# Altium footprint library Connectors.PcbLib: 92 footprints (part 3 of 6)
Each footprint in its own frame and in the unit in brackets; x right, y up, seen from the top. Pads: shape width x height; smd on the part's side, far side on the other; paste and mask are expansions set on the pad; w line width, h text height; cw(c..) or ccw(c..) is an arc to the next point about the centre after c.
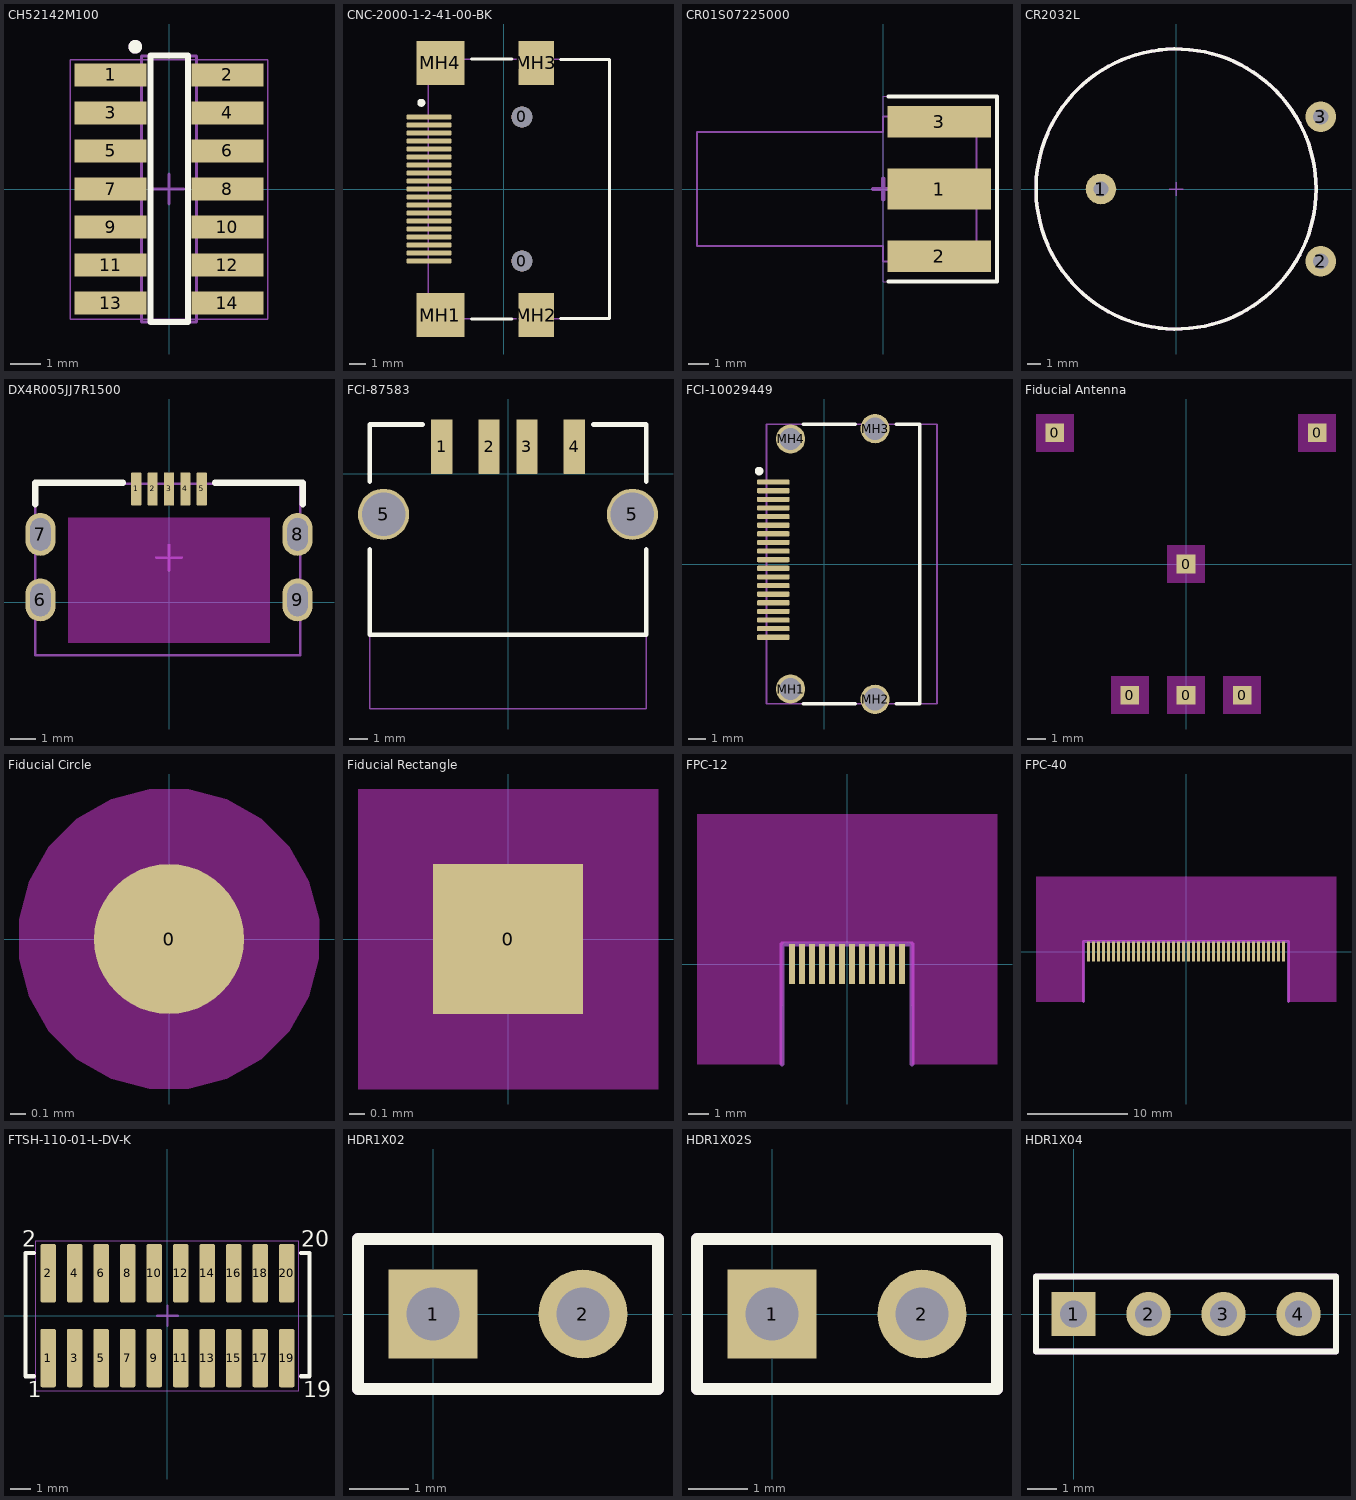
[diagram p2: the footprints below, top view; thin cyan lines are the x and y axes]

## CH52142M100 [mm]
height 5.5
pads (14):
  rect 2.4x0.762 smd: 1(-1.95,3.81) 2(1.95,3.81) 3(-1.95,2.54) 4(1.95,2.54) 5(-1.95,1.27) 6(1.95,1.27) 7(-1.95,0) 8(1.95,0) 9(-1.95,-1.27) 10(1.95,-1.27) 11(-1.95,-2.54) 12(1.95,-2.54) 13(-1.95,-3.81) 14(1.95,-3.81)
Top Overlay:
  circle w0.254: c-1.125,4.75 r0.1
  lines w0.2: -0.617,-4.445 -0.617,4.46 0.633,4.46 0.633,-4.445 -0.617,-4.445
Mechanical 13:
  circle w0.254: c-1.125,4.75 r0.1
  lines w0.1: -0.925,-4.45 -0.925,4.45 0.925,4.45 0.925,-4.45 -0.925,-4.45
  text ".Designator" at 0.05,1.225 h0.51
  text ".Comment" at -0.65,1.2 h0.51
Mechanical 15:
  lines w0.05: -3.3,-4.35 -3.3,4.325 3.3,4.325 3.3,-4.35 -3.3,-4.35
  lines w0.1: -0.5,0 0.5,0 ; 0,-0.5 0,0.5
3D body "Samtec-FTSH-107-01-L-DV.step": height 5.97, standoff 0, extent -2.921,-4.445 2.921,4.445

## CNC-2000-1-2-41-00-BK [mm] "HDMI Type C, Female, Right-Angle, SMT"
height 6.3
pads (25):
  round 1.3 hole 1.3 unplated paste-1.3 mask-1.3: 0(1.124,-4.5) 0(1.124,4.5)
  rrect50% 2.82x0.33 smd: 1(-4.686,4.5) 2(-4.686,4) 3(-4.686,3.5) 4(-4.686,3) 5(-4.686,2.5) 6(-4.686,2) 7(-4.686,1.5) 8(-4.686,1) 9(-4.686,0.5) 10(-4.686,0) 11(-4.686,-0.5) 12(-4.686,-1) 13(-4.686,-1.5) 14(-4.686,-2) 15(-4.686,-2.5) 16(-4.686,-3) 17(-4.686,-3.5) 18(-4.686,-4) 19(-4.686,-4.5)
  rect 3x2.75 smd: MH1(-3.976,-7.875) MH4(-3.976,7.875)
  rect 2.2x2.75 smd: MH2(2.024,-7.875) MH3(2.024,7.875)
Top Overlay:
  circle w0.25: c-5.161,5.39 r0.125
  lines w0.2: -2.032,-8.128 0.508,-8.128 ; -2.032,8.128 0.508,8.128 ; 3.556,-8.1 6.604,-8.1 6.604,8.1 3.556,8.1
Mechanical 13:
  lines w0.1: -4.736,-8.1 -4.736,8.1 6.604,8.1 6.604,-8.1 -4.736,-8.1
  text ".Designator" at -2.186,6.1 h0.51
  text ".Comment" at -2.161,5.4 h0.51

## CR01S07225000 [mm] "Board edge SMA female jack connector"
height 3.5
pads (3):
  rect 5x2 smd: 1(2.7,0)
  rect 5x1.5 smd: 2(2.7,-3.25) 3(2.7,3.25)
Top Overlay:
  lines w0.2: 0.25,-4.475 5.5,-4.475 5.5,0 5.5,4.475 0.25,4.475
Mechanical 13:
  lines w0.1: -9,-2.75 0,-2.75 0,-3.5 4.5,-3.5 4.5,0 4.5,3.5 0,3.5 0,2.75 -9,2.75 -9,0 -9,-2.75
  text ".Designator" at -2.125,0.1 h0.51
  text ".Comment" at -2.1,-0.6 h0.51
Mechanical 15:
  lines w0.05: 0,-4.475 5.5,-4.475 5.5,4.475 0,4.475 0,-4.475
  lines w0.2: -0.5,0 0.5,0 ; 0,-0.5 0,0.5
3D body "SMA Female for PCB edge Mount.STEP": height 3.45, standoff -2.6, extent -9.6,-3 4,3

## CR2032L [mm] "Lithium coincell 3V"
height 6
pads (3):
  round 2.2 hole 1.1: 1(-5.4,0) 2(10.4,-5.2) 3(10.4,5.2)
Top Overlay:
  circle w0.254: c0,0 r10.07
Mechanical 13:
  circle w0.254: c0,0 r10.07
  text ".Comment" at -1.875,7.2 h0.51
  text ".Designator" at -1.9,7.9 h0.51
Mechanical 15:
  circle w0.1: c0,0 r10.07
  lines w0.1: -0.5,0 0.5,0 ; 0,-0.5 0,0.5
3D body "cr2032l.step": height 5.4, standoff -3.75, extent -10.05,-10.07 10.44,10.041

## DX4R005JJ7R1500 [mm] "MicroUSB A/B SMT, midmount"
height 1.2
pads (9):
  rrect10% 0.4x1.3 smd: 1(-1.3,4.5) 2(-0.65,4.5) 3(0,4.5) 4(0.65,4.5) 5(1.3,4.5)
  oval 1.2x1.7 hole 0.8 slot 1.3 at 90 deg: 6(-5.1,0.1) 7(-5.1,2.7) 8(5.1,2.7) 9(5.1,0.1)
Top Overlay:
  lines w0.254: -5.3,3.9 -5.3,4.75 -1.825,4.75 ; 1.825,4.75 5.3,4.75 5.3,3.9
Keep-Out Layer:
  board cut-out: -4,3.35 4,3.35 4,-1.6 -4,-1.6
Mechanical 13:
  lines w0.1: -5.3,-2.1 5.2,-2.1 5.2,4.7 -5.3,4.7 -5.3,-2.1
  text ".Designator" at -4.5,6.15 h0.51
  text ".Comment" at -4.5,5.475 h0.51
Mechanical 15:
  lines w0.1: -0.5,1.775 0.5,1.775 ; 0,1.275 0,2.275
3D body "K3D-DX4R005JJ7-V1_JAE_Color.STEP": height 1.23, standoff -1.61, extent -5.25,-2.1 5.25,4.65

## FCI-87583 [mm] "USB A 2.0 connector Female, SMT"
height 7.74
pads (6):
  rect 1.12x2.88 smd: 1(-3.5,1.44) 2(-1,1.44) 3(1,1.44) 4(3.5,1.44)
  round 2.7 hole 2.3: 5(-6.57,-2.14) 5(6.57,-2.14)
Top Overlay:
  lines w0.254: -7.3,-4 -7.3,-8.5 7.3,-8.5 7.3,-4 ; -7.3,-0.4 -7.3,2.6 -4.5,2.6 ; 4.5,2.6 7.3,2.6 7.3,-0.4
Mechanical 13:
  lines w0.1: -7.3,-4 -7.3,-12.4 7.3,-12.4 7.3,-4 ; -7.3,-0.4 -7.3,2.6 -4.5,2.6 ; 4.5,2.6 7.3,2.6 7.3,-0.4
3D body "875830010bhlf.stp": height 7.74, standoff -2.63, extent -7.25,-12.4 7.25,2.483

## FCI-10029449 [mm] "HDMI Type C, Female, Right-Angle, SMT"
height 3.3
pads (23):
  rrect50% 1.9x0.3 smd: 1(-2.95,4.75) 2(-2.95,4.25) 3(-2.95,3.75) 4(-2.95,3.25) 5(-2.95,2.75) 6(-2.95,2.25) 7(-2.95,1.75) 8(-2.95,1.25) 9(-2.95,0.75) 10(-2.95,0.25) 11(-2.95,-0.25) 12(-2.95,-0.75) 13(-2.95,-1.25) 14(-2.95,-1.75) 15(-2.95,-2.25) 16(-2.95,-2.75) 17(-2.95,-3.25) 18(-2.95,-3.75) 19(-2.95,-4.25)
  round 1.7 hole 1.3 paste+0.038 mask+0: MH1(-1.95,-7.25) MH2(2.95,-7.85) MH3(2.95,7.85) MH4(-1.95,7.25)
Top Overlay:
  circle w0.25: c-3.775,5.39 r0.125
  lines w0.2: -1.2,-8.1 1.8,-8.1 ; -1.2,8.1 1.8,8.1 ; 4.168,-8.1 5.55,-8.1 5.55,8.1 4.194,8.1
Mechanical 13:
  lines w0.1: -3.35,-8.1 -3.35,8.1 6.55,8.1 6.55,-8.1 -3.35,-8.1
  text ".Designator" at -0.8,6.1 h0.51
  text ".Comment" at -0.775,5.4 h0.51
3D body "10029449-001LF.STEP": height 6.11, standoff -1.89, extent -3.35,-8.1 6.55,8.1

## Fiducial Antenna [mm] "Fiducial mark for antenna"
pads (6):
  rect 1x1 smd paste-0.75 mask+0.5: 0(-7,7) 0(-3,-7) 0(0,-7) 0(0,0) 0(3,-7) 0(7,7)
Top Layer keep-out:
  region: 2,-6 4,-6 4,-8 2,-8
  region: -4,-6 -2,-6 -2,-8 -4,-8
  region: -1,-6 1,-6 1,-8 -1,-8
  region: 6,8 8,8 8,6 6,6
  region: -8,8 -6,8 -6,6 -8,6
  region: -1,1 1,1 1,-1 -1,-1

## Fiducial Circle [mm]
pads (1):
  round 1 smd paste-0.75 mask+0.5: 0(0,0)
Top Layer keep-out:
  region: 0,1 0.132,1 0.386,0.932 0.614,0.8 0.8,0.614 0.932,0.386 1,0.132 1,-0.132 0.932,-0.386 0.8,-0.614 0.614,-0.8 0.386,-0.932 0.132,-1 0,-1 -0.132,-1 -0.386,-0.932 -0.614,-0.8 -0.8,-0.614 -0.932,-0.386 -1,-0.132 -1,0.132 -0.932,0.386 -0.8,0.614 -0.614,0.8 -0.386,0.932 -0.132,1

## Fiducial Rectangle [mm]
pads (1):
  rect 1x1 smd paste-0.75 mask+0.5: 0(0,0)
Top Layer keep-out:
  region: -1,1 1,1 1,-1 -1,-1

## FPC-12 [mm] "FPC PCB connector 12 pin"
pads (12):
  rect 0.3x2 smd paste-2 mask-1: 1(-2.75,0) 2(-2.25,0) 3(-1.75,0) 4(-1.25,0) 5(-0.75,0) 6(-0.25,0) 7(0.25,0) 8(0.75,0) 9(1.25,0) 10(1.75,0) 11(2.25,0) 12(2.75,0)
Top Solder:
  region: -3,-1.1 -3,1.1 3,1.1 3,-1.1
Keep-Out Layer:
  board cut-out: -3,1.1 -3.049,1.095 -3.139,1.058 -3.208,0.989 -3.245,0.899 -3.25,0.85 -3.25,-5 -7.5,-5 -7.5,7.5 7.5,7.5 7.5,-5 3.25,-5 3.25,0.85 3.245,0.899 3.208,0.989 3.139,1.058 3.049,1.095 3,1.1
Mechanical 13:
  lines w0.254: -3.25,-5 -3.25,1 3.25,1 3.25,-5

## FPC-40 [mm] "FPC PCB connector 40 pin"
pads (40):
  rect 0.3x2 smd paste-2 mask-1: 1(-9.75,0) 2(-9.25,0) 3(-8.75,0) 4(-8.25,0) 5(-7.75,0) 6(-7.25,0) 7(-6.75,0) 8(-6.25,0) 9(-5.75,0) 10(-5.25,0) 11(-4.75,0) 12(-4.25,0) 13(-3.75,0) 14(-3.25,0) 15(-2.75,0) 16(-2.25,0) 17(-1.75,0) 18(-1.25,0) 19(-0.75,0) 20(-0.25,0) 21(0.25,0) 22(0.75,0) 23(1.25,0) 24(1.75,0) 25(2.25,0) 26(2.75,0) 27(3.25,0) 28(3.75,0) 29(4.25,0) 30(4.75,0) 31(5.25,0) 32(5.75,0) 33(6.25,0) 34(6.75,0) 35(7.25,0) 36(7.75,0) 37(8.25,0) 38(8.75,0) 39(9.25,0) 40(9.75,0)
Top Solder:
  region: -10,-1.1 -10,1.1 10,1.1 10,-1.1
Keep-Out Layer:
  board cut-out: -10,1.1 -10.049,1.095 -10.139,1.058 -10.208,0.989 -10.245,0.899 -10.25,0.85 -10.25,-5 -15,-5 -15,7.5 15,7.5 15,-5 10.25,-5 10.25,0.85 10.245,0.899 10.208,0.989 10.139,1.058 10.049,1.095 10,1.1
Mechanical 13:
  lines w0.254: -10.25,-5 -10.25,1 10.25,1 10.25,-5

## FTSH-110-01-L-DV-K [mil] "Connector; Header; 10x2 Position,1.27mm SMT"
height 235.04
pads (20):
  rrect20% 29x110 smd: 1(-225,-80) 2(-225,80) 3(-175,-80) 4(-175,80) 5(-125,-80) 6(-125,80) 7(-75,-80) 8(-75,80) 9(-25,-80) 10(-25,80) 11(25,-80) 12(25,80) 13(75,-80) 14(75,80) 15(125,-80) 16(125,80) 17(175,-80) 18(175,80) 19(225,-80) 20(225,80)
Top Overlay:
  lines w7.87: -251.97,-114.17 -267.72,-114.17 -267.72,118.11 -251.97,118.11 ; 251.97,-114.17 267.72,-114.17 267.72,118.11 251.97,118.11
  text "19" at 255.91,-153.54 h30
  text "20" at 251.97,129.92 h30
  text "1" at -263.78,-153.54 h30
  text "2" at -273.62,129.92 h30
Mechanical 13:
  lines w1.97: -248.03,-141.73 -248.03,141.73 248.03,141.73 248.03,-141.73 -248.03,-141.73
  text ".Comment" at -90.55,-21.65 h20
  text ".Designator" at -110.24,7.87 h20
Mechanical 15:
  lines w1.97: -248.03,-141.73 248.03,-141.73 248.03,141.73 -248.03,141.73 -248.03,-141.73
  lines w3.94: -19.68,-0.12 19.68,-0.12 ; 0,-19.8 0,19.57
3D body "Samtec-FTSH-110-01-L-DV-K.STEP": height 241, standoff 0, extent -248.49,-115.11 248.51,114.89

## HDR1X02 [mm] "Connector; Header; 2 Position"
pads (2):
  rect 1.5x1.5 hole 0.9: 1(0,0)
  round 1.5 hole 0.9: 2(2.54,0)
Top Overlay:
  lines w0.2: -1.27,-1.27 3.81,-1.27 3.81,1.27 -1.27,1.27 -1.27,-1.27
Mechanical 13:
  lines w0.2: -1.27,-1.27 3.81,-1.27 3.81,1.27 -1.27,1.27 -1.27,-1.27
  text ".Designator" at -1.125,1.625 h0.51
  text ".Comment" at -0.675,-1.925 h0.51
3D body "pin_header_aw_109_02-t.stp": height 8.2, standoff -3, extent -1.17,-1.251 3.91,1.245

## HDR1X02S [mm] "Connector; Header; 2 Position"
pads (2):
  rect 1.5x1.5 hole 0.9: 1(0,0)
  round 1.5 hole 0.9: 2(2.54,0)
Top Overlay:
  lines w0.2: -1.27,-1.27 3.81,-1.27 3.81,1.27 -1.27,1.27 -1.27,-1.27
Mechanical 13:
  lines w0.2: -1.27,-1.27 3.81,-1.27 3.81,1.27 -1.27,1.27 -1.27,-1.27
  text ".Designator" at -1.125,1.625 h0.51
  text ".Comment" at -0.675,-1.925 h0.51

## HDR1X04 [mm] "Connector; Header; 4 Position"
pads (4):
  rect 1.5x1.5 hole 0.9: 1(0,0)
  round 1.5 hole 0.9: 2(2.54,0) 3(5.08,0) 4(7.62,0)
Top Overlay:
  lines w0.2: -1.27,-1.27 -1.27,1.27 8.89,1.27 8.89,-1.27 -1.27,-1.27
Mechanical 13:
  lines w0.2: -1.27,-1.27 8.89,-1.27 8.89,1.27 -1.27,1.27 -1.27,-1.27
  text ".Designator" at -1.125,1.625 h0.51
  text ".Comment" at -0.675,-1.925 h0.51
3D body "pin_header_aw_109_04-t.stp": height 8.2, standoff -3, extent -1.17,-1.251 8.99,1.245